# Altium footprint library CUSTOM PCB.PcbLib: 404 footprints (part 10 of 26)
Each footprint in its own frame and in the unit in brackets; x right, y up, seen from the top. Pads: shape width x height; smd on the part's side, far side on the other; paste and mask are expansions set on the pad; w line width, h text height; cw(c..) or ccw(c..) is an arc to the next point about the centre after c.
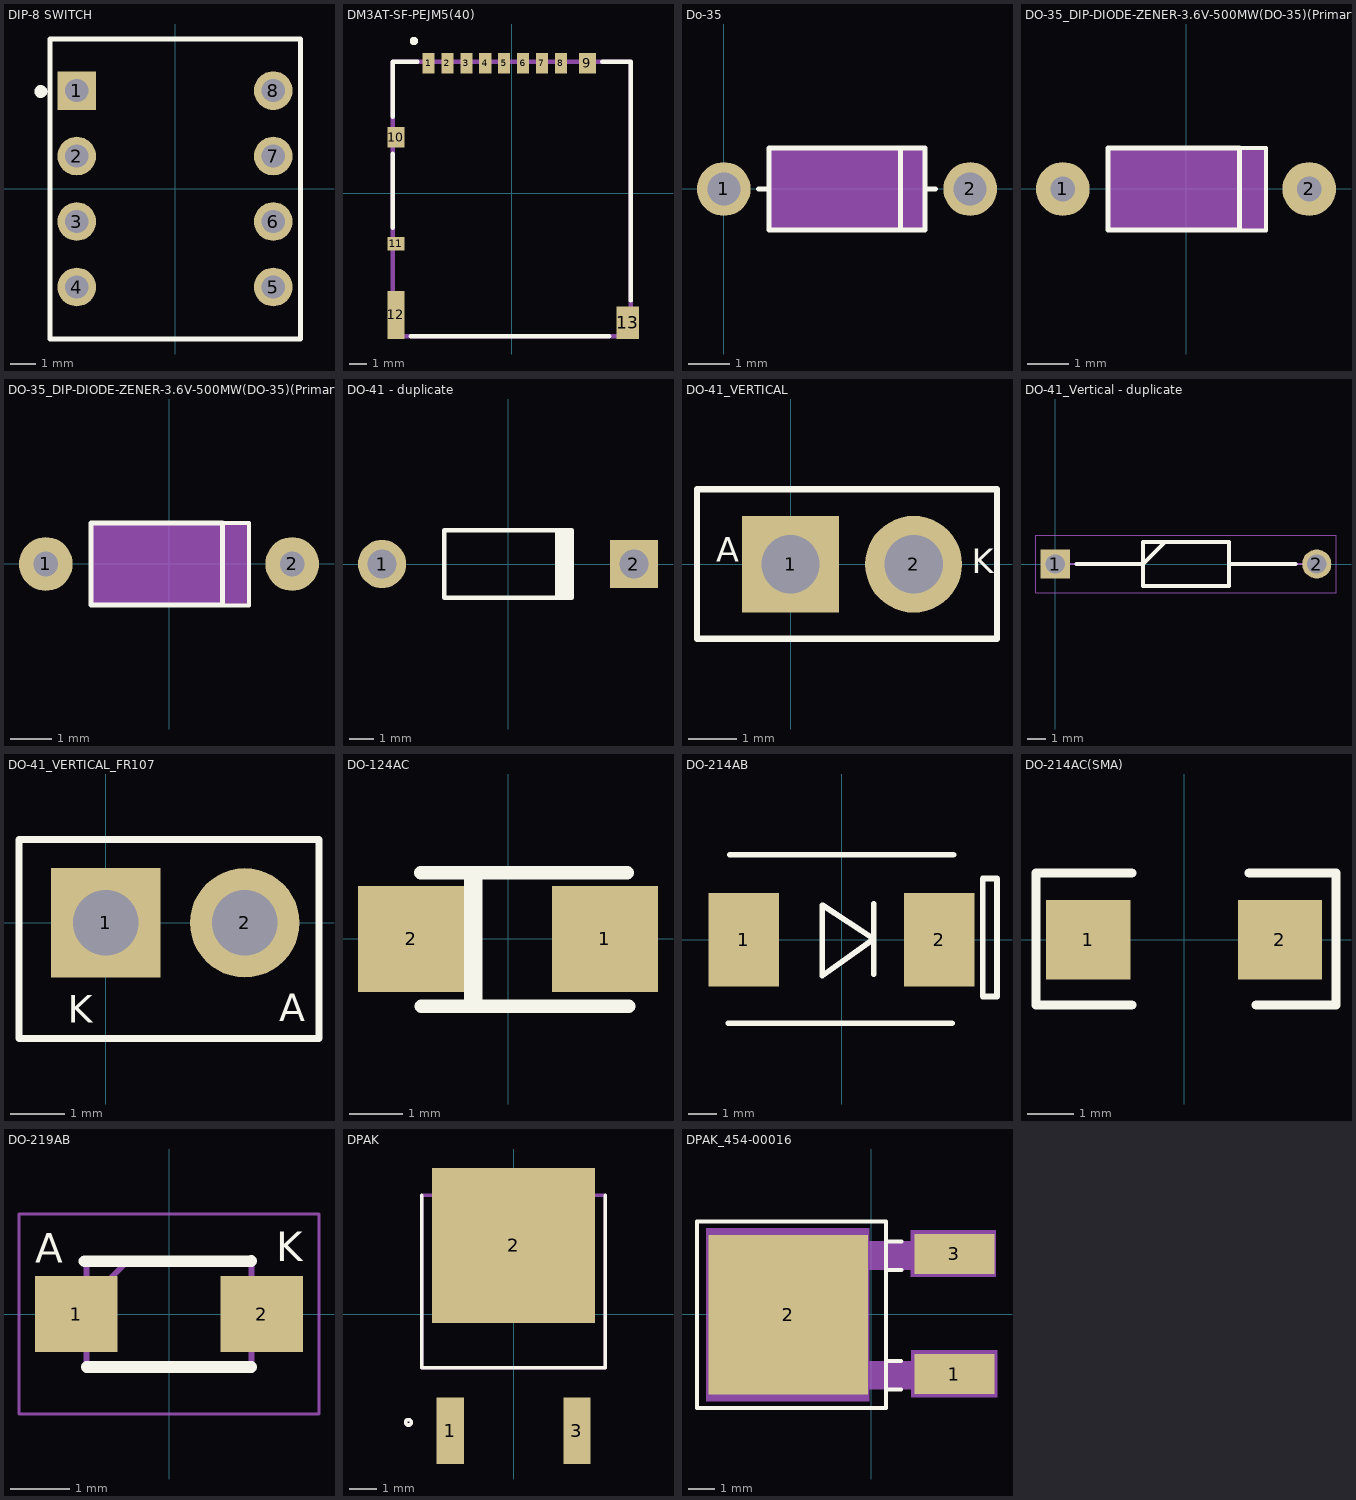
[diagram p9: the footprints below, top view; thin cyan lines are the x and y axes]

## DIP-8 SWITCH [mm]
pads (8):
  rect 1.5x1.5 hole 0.9: 1(-3.81,3.81)
  round 1.5 hole 0.9: 2(-3.81,1.27) 3(-3.81,-1.27) 4(-3.81,-3.81) 5(3.81,-3.81) 6(3.81,-1.27) 7(3.81,1.27) 8(3.81,3.81)
Top Overlay:
  circle w0.25: c-5.207,3.775 r0.125
  lines w0.2: -4.85,-5.826 -4.85,5.812 -0.007,5.812 4.863,5.812 4.863,-5.826 -4.85,-5.826
3D body "DIP Red 4-way.step": height 6.7, standoff -2, extent -4.95,-5.76 4.95,5.76

## Dipole antenna [mm]
3D body: height 12.7, standoff 0, extent -1.226,-0.354 0.292,1.167
3D body: height 0.25, standoff 0, extent -0.025,0.076 -0.025,0.076
3D body: height 13.59, standoff 12.06, extent -1.233,-0.353 0.291,1.165
3D body: height 13.58, standoff 12.06, extent -25.87,-0.354 -0.47,1.167

## DM3AT-SF-PEJM5(40) [mm]
pads (13):
  rect 0.7x1.2 smd: 1(-4.85,7.55) 2(-3.75,7.55) 3(-2.65,7.55) 4(-1.55,7.55) 5(-0.45,7.55) 6(0.65,7.55) 7(1.75,7.55) 8(2.85,7.55)
  rect 1x1.2 smd: 9(4.4,7.55) 10(-6.75,3.25)
  rect 1x0.8 smd: 11(-6.75,-2.95)
  rect 1x2.8 smd: 12(-6.75,-7.1)
  rect 1.3x1.9 smd: 13(6.75,-7.55)
Top Overlay:
  circle w0.254: c-5.698,8.85 r0.116
  lines w0.254: -6.925,-2.032 -6.925,2.288 ; -6.925,4.437 -6.925,7.65 -5.49,7.65 ; -5.883,-8.35 5.669,-8.35 ; 5.253,7.65 6.925,7.65 6.925,-6.26
Mechanical 15:
  lines w0.254: -6.925,-8.35 -6.925,7.65 6.925,7.65 6.925,-8.35 -6.925,-8.35
3D body "DM3AT-SF-PEJM5--3DModel-STEP-56544.STEP": height 1.68, standoff 0, extent -7.021,-8.373 6.829,7.777

## Do-35 [mm] "6mm pitch"
pads (2):
  round 1.308 hole 0.8: 1(0,0) 2(6,0)
Top Overlay:
  lines w0.127: 0.841,0 1.095,0 ; 4.905,0 5.159,0 ; 4.3,-1 4.9,-1 4.9,1 4.3,1 ; 4.3,-1 1.1,-1 1.1,1 4.3,1 ; 4.3,-1 4.3,1
Mechanical 4:
  region: 4.905,-1.017 1.093,-1.017 1.093,1.016 4.905,1.016
3D body "User Library-diode6mm.STEP": height 1.66, standoff -3.34, extent -0.64,-1.035 6.66,0.965

## DO-35_DIP-DIODE-ZENER-3.6V-500MW(DO-35)(Primary) [mm]
pads (2):
  round 1.308 hole 0.6: 1(-3,0) 2(3,0)
Top Overlay:
  lines w0.1: 1.3,-1.016 1.953,-1.016 1.953,1 1.3,1
  lines w0.127: -1.9,-1 1.3,-1 1.3,1 -1.9,1 -1.9,-1
Mechanical 16:
  region: 1.905,-1.017 -1.908,-1.017 -1.908,1.016 1.905,1.016

## DO-35_DIP-DIODE-ZENER-3.6V-500MW(DO-35)(Primary) - duplicate [mm]
pads (2):
  round 1.308 hole 0.6: 1(-3,0) 2(3,0)
Top Overlay:
  lines w0.1: 1.3,-1.016 1.953,-1.016 1.953,1 1.3,1
  lines w0.127: -1.9,-1 -1.9,1 1.3,1 1.3,-1 -1.9,-1
Mechanical 16:
  region: 1.905,-1.017 -1.908,-1.017 -1.908,1.016 1.905,1.016

## DO-41 - duplicate [mm] "Diode, Axial; Body 5.2 x 2.7 mm (LxDia. max), Lead Dia. 0.86 mm (max)"
height 2.8
pads (2):
  round 2 hole 1.2: 1(-5.23,0)
  rect 2x2 hole 1.2: 2(5.23,0)
Top Overlay:
  rectangle: 1.95,-1.4 2.75,1.4
  lines w0.2: 2.65,-1.4 -2.65,-1.4 -2.65,1.4 2.65,1.4

## DO-41_VERTICAL [mm] "Diode, Axial; Body 5.2 x 2.7 mm (LxDia. max), Lead Dia. 0.86 mm (max)"
height 2.8
pads (2):
  rect 2x2 hole 1.2: 1(0,0)
  round 2 hole 1.2: 2(2.54,0)
Top Overlay:
  lines w0.127: -1.933,-1.537 4.26,-1.537 4.26,1.547 -1.933,1.547 -1.933,-1.537
  text "A" at -1.534,0.049 h0.51
  text "K" at 3.735,-0.187 h0.51
3D body "Diod DO-41 Vertical.STEP": height 9.89, standoff -4.25, extent -0.246,-1.441 4.089,1.289

## DO-41_Vertical - duplicate [mm]
pads (2):
  rect 1.575x1.575 / inner round 1.575 / far side rect 1.575x1.575 hole 1.05: 1(0,0)
  round 1.575 hole 1.05: 2(14.1,0)
Top Overlay:
  lines w0.2: 1.138,0 4.735,0 5.922,1.188 ; 9.365,0 12.962,0 ; 4.735,-1.188 9.365,-1.188 9.365,1.188 4.735,1.188 4.735,-1.188
Mechanical 15:
  lines w0.1: 0,0 4.735,0 5.923,1.188 ; 9.365,0 14.1,0 ; 4.735,-1.187 9.365,-1.187 9.365,1.188 4.735,1.188 4.735,-1.187
Mechanical 20:
  lines w0.05: -1.038,-1.537 15.137,-1.537 15.137,1.538 -1.038,1.538 -1.038,-1.537

## DO-41_VERTICAL_FR107 [mm] "Diode, Axial; Body 5.2 x 2.7 mm (LxDia. max), Lead Dia. 0.86 mm (max)"
height 2.8
pads (2):
  rect 2x2 hole 1.2: 1(0,0)
  round 2 hole 1.2: 2(2.54,0)
Top Overlay:
  lines w0.127: -1.587,-2.113 -1.587,1.521 3.896,1.521 3.896,-2.113 -1.587,-2.113
  text "A" at 3.167,-1.799 h0.51
  text "K" at -0.697,-1.826 h0.51
3D body "Diod DO-41 Vertical.STEP": height 9.89, standoff -4.25, extent -1.377,-1.403 2.958,1.327

## DO-124AC [mm]
pads (2):
  rect 2x2 smd: 1(1.83,0) 2(-1.83,0)
Top Overlay:
  region: -0.821,1.262 -0.485,1.262 -0.485,-1.17 -0.821,-1.17
  lines w0.254: -1.644,1.25 2.25,1.25 ; -1.636,-1.268 2.276,-1.268
3D body "M7.stp": height 2.7, standoff 0, extent -2.623,-1.369 2.577,1.356

## DO-214AB [mm]
pads (2):
  rect 2.5x3.3 smd: 1(-3.45,0) 2(3.45,0)
Top Overlay:
  lines w0.2: -4,-2.95 3.899,-2.95 ; -3.949,3 3.95,3 ; 1.143,-1.219 1.143,0.025 ; 1.143,1.27 1.143,0.025 ; 1.143,0.025 -0.686,1.219 -0.686,-1.27 1.143,0.025 ; 4.978,-2.007 4.978,2.159 5.486,2.159 5.486,-2.007 4.978,-2.007
3D body "User Library-DO-214AB SMC.x_t": height 2.2, standoff -0.1, extent -3.975,-2.95 3.975,2.95

## DO-214AC(SMA) [mm]
pads (2):
  rect 1.8x1.7 smd: 1(-2.05,0) 2(2.05,0)
Top Overlay:
  lines w0.2: -1.12,-1.395 -3.167,-1.395 -3.167,1.433 -1.12,1.433 ; 1.399,1.433 3.252,1.433 3.252,-1.395 1.546,-1.395
3D body "User Library-DO-214AC(SMA).STEP": height 2.21, standoff -0.08, extent -2.744,-1.397 2.743,1.396

## DO-219AB [mm]
pads (2):
  rect 1.4x1.3 smd: 1(-1.575,0) 2(1.575,0)
Top Overlay:
  lines w0.2: -1.436,0.896 1.4,0.9 ; -1.4,-0.9 1.4,-0.9
  text "K" at 1.821,0.9 h0.5
  text "A" at -2.27,0.867 h0.5
Mechanical 15:
  lines w0.1: -1.4,0.2 -0.7,0.9 ; -1.4,-0.9 1.4,-0.9 1.4,0.9 -1.4,0.9 -1.4,-0.9
Mechanical 20:
  lines w0.05: -2.55,-1.7 2.55,-1.7 2.55,1.7 -2.55,1.7 -2.55,-1.7
3D body "BZD27C47P-E3-08.stp": height 1.08, standoff 0, extent -1.796,-0.905 1.904,0.895

## DPAK [mm]
pads (3):
  rect 0.98x2.4 smd: 1(-2.28,-4.2) 3(2.28,-4.2)
  rect 5.86x5.57 smd: 2(0,2.47)
Top Overlay:
  circle w0.127: c-3.786,-3.9 r0.1
  lines w0.127: -3.3,4.27 -3.3,-1.93 3.3,-1.93 3.3,4.27
Mechanical 4:
  circle w0.127: c-3.786,-3.9 r0.1
  circle w0.127: c-3.786,-3.9 r0.1
  lines w0.127: -3.3,-1.93 -3.3,4.27 ; -3.3,-1.93 3.3,-1.93 ; -3.3,-1.93 -3.3,4.27 ; -3.3,-1.93 3.3,-1.93 ; -3.3,4.27 3.3,4.27 ; -3.3,4.27 3.3,4.27 ; 3.3,-1.93 3.3,4.27 ; 3.3,-1.93 3.3,4.27
3D body "User Library-DPAK_TO-252AA.STEP": height 2.37, standoff -0.03, extent -3.367,-4.955 3.367,5.145

## DPAK_454-00016 [mil]
pads (3):
  rect 120x60 smd: 1(125,-90.37) 3(125,90.37)
  rect 240.16x240.16 smd: 2(-125,-1)
Top Overlay:
  lines w5.91: 21.85,-113.37 45.08,-113.37 ; 21.85,-70.73 45.08,-70.73 ; 21.85,66.16 45.71,66.16 ; 21.85,108.76 45.71,108.76
  lines w5.98: -262.01,-141 22.01,-141 22.01,139 -262.01,139 -262.01,-141
Mechanical 18:
  region: 86.02,-113.21 86.02,-70.69 -2.95,-70.69 -2.95,-113.21
  region: 86.02,-113.21 101.77,-113.21 101.77,-70.69 86.02,-70.69
  region: 101.77,-113.21 168.7,-113.21 168.7,-70.69 101.77,-70.69
  region: 101.77,66.71 168.7,66.71 168.7,109.23 101.77,109.23
  region: 86.02,66.71 101.77,66.71 101.77,109.23 86.02,109.23
  region: 86.02,66.71 86.02,109.23 -2.95,109.23 -2.95,66.71
  region: -2.95,129 -247.99,129 -247.99,-131 -2.95,-131
Mechanical 19:
  pour cut-out: -2.95,-131 -2.95,129 -247.99,129 -247.99,-131
  pour cut-out: 60,-125.37 189.02,-125.37 189.02,-54.35 60,-54.35
  pour cut-out: 59.02,55.65 187.01,55.65 187.01,125.65 59.02,125.65
Mechanical 21:
  text "DFA=GEXX-12XX" at -71.14,-137.97 h25
Mechanical 22:
  text "0.2" at -115.08,-27.5 h25
3D body "DPAK-3-M.step": height 67.09, standoff -2.01, extent -227.15,-132.52 90.45,132.52